# Altium footprint library PART.PcbLib: 407 footprints (part 20 of 26)
Each footprint in its own frame and in the unit in brackets; x right, y up, seen from the top. Pads: shape width x height; smd on the part's side, far side on the other; paste and mask are expansions set on the pad; w line width, h text height; cw(c..) or ccw(c..) is an arc to the next point about the centre after c.
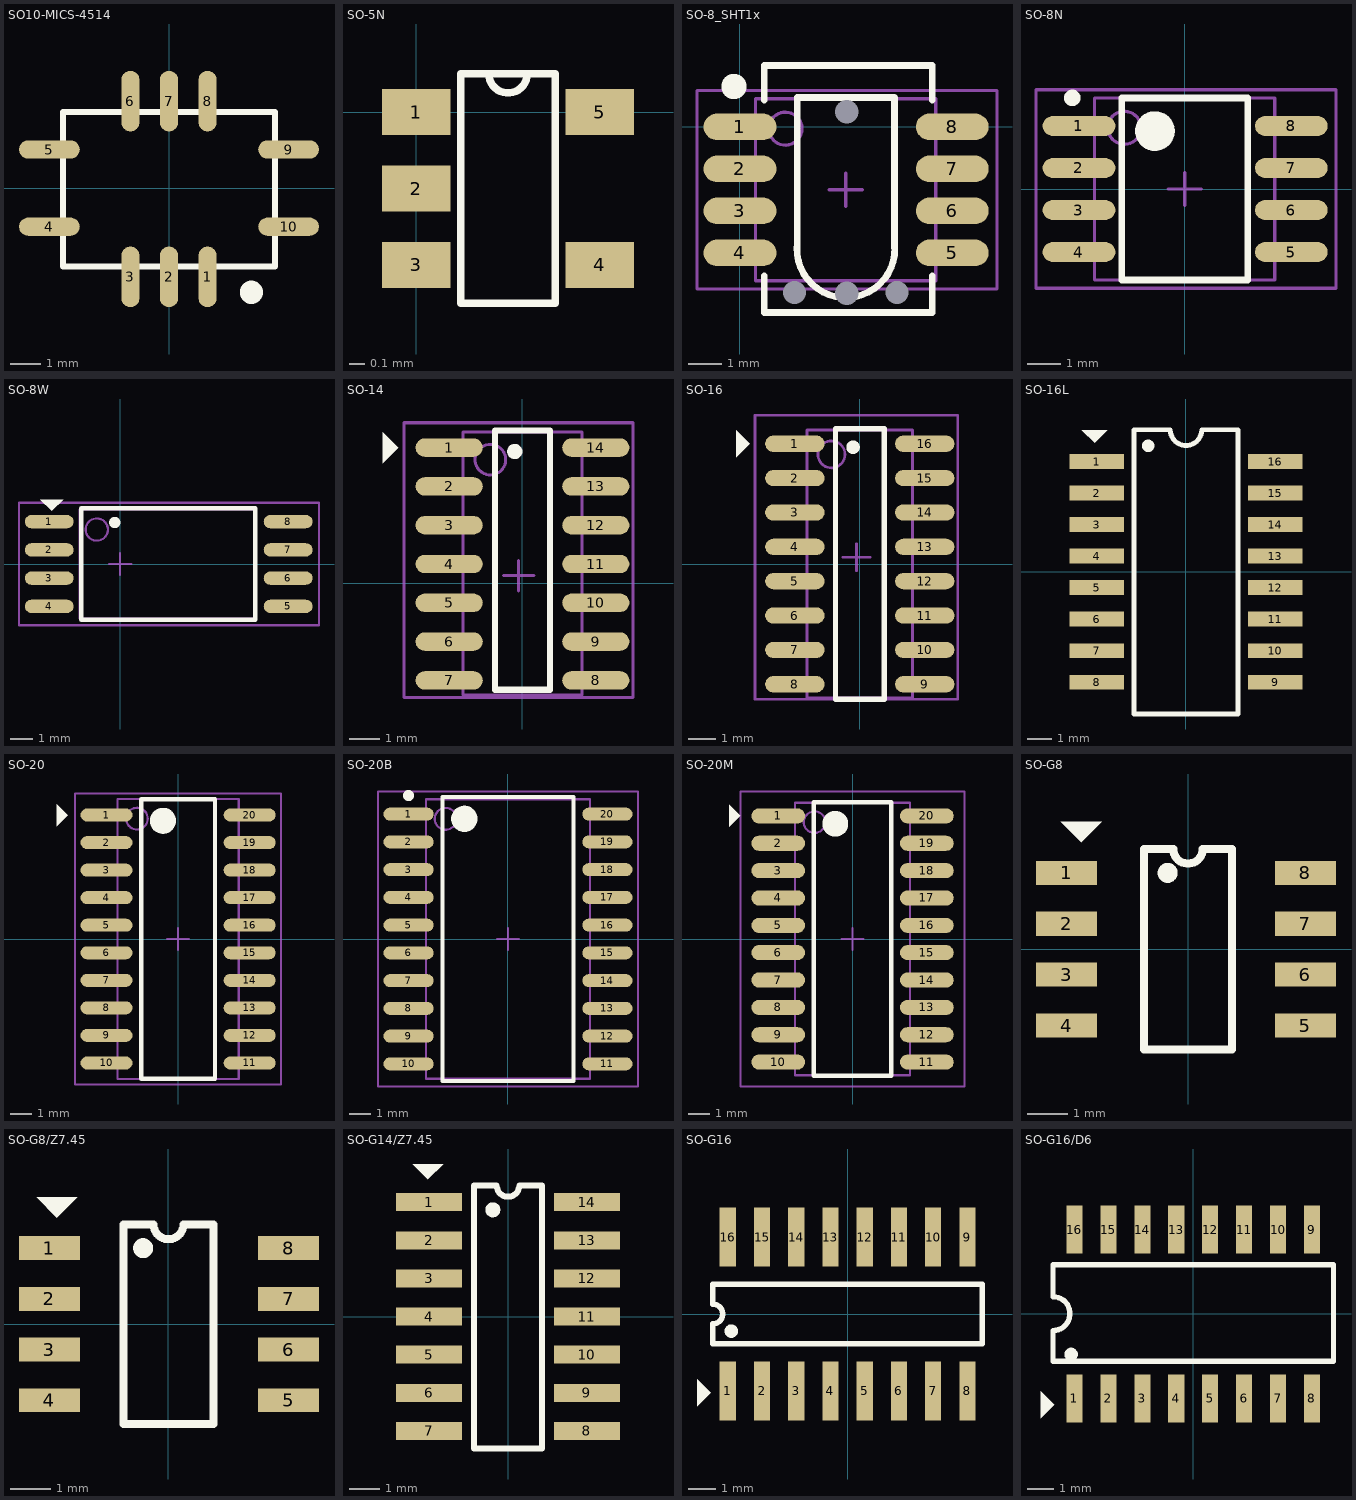
[diagram p19: the footprints below, top view; thin cyan lines are the x and y axes]

## SO10-MICS-4514 [mm] "10 pn"
pads (10):
  oval 0.6x2 smd: 1(1.27,-2.921) 2(0,-2.921) 3(-1.27,-2.921) 6(-1.27,2.863) 7(0,2.863) 8(1.27,2.863)
  oval 2x0.6 smd: 4(-3.937,-1.27) 5(-3.937,1.27) 9(3.937,1.27) 10(3.937,-1.27)
Top Overlay:
  circle w0.6: c2.713,-3.429 r0.081
  lines w0.203: -3.492,-2.574 -3.492,2.506 3.492,2.506 3.492,-2.574 -3.492,-2.574

## SO-5N [mm]
pads (5):
  rect 0.45x0.3 smd mask+0.05: 1(0,0) 2(0,-0.5) 3(0,-1) 4(1.2,-1) 5(1.2,0)
Top Overlay:
  lines w0.05: 0.29,-1.25 0.91,-1.25 0.91,0.25 0.475,0.25 ccw(c0.6,0.25) 0.725,0.25 0.29,0.25 0.29,-1.25

## SO-8_SHT1x [mm] "SOP, 8-Leads, Body 5.3x5.3mm, Pitch 1.27mm, IPC Medium Density"
height 2.03
pads (12):
  round 0 hole 0.7: 0(1.651,-5.004) 0(3.226,-5.029) 0(3.226,0.457) 0(4.75,-5.004)
  oval 2.2x0.8 smd: 1(0,0) 2(0,-1.27) 3(0,-2.54) 4(0,-3.81) 5(6.419,-3.81) 6(6.419,-2.54) 7(6.419,-1.27) 8(6.419,0)
Top Overlay:
  circle w0.6: c-0.183,1.219 r0.081
  lines w0.2: 0.737,-4.5 0.737,-5.613 5.817,-5.613 5.817,-4.5 ; 0.737,0.8 0.737,1.854 5.817,1.854 5.817,0.8
  lines w0.203: 1.72,-3.645 ccw(c3.2,-3.683) 4.681,-3.659 ; 1.727,-3.708 1.727,0.889 4.674,0.889 4.674,-3.658
Mechanical 13:
  circle w0.1: c1.372,-0.055 r0.5
  lines w0.1: 0.472,-4.655 0.472,0.845 5.922,0.845 5.922,-4.655 0.472,-4.655
Mechanical 15:
  lines w0.1: 2.697,-1.905 3.697,-1.905 ; 3.197,-2.405 3.197,-1.405 ; -1.299,-4.905 -1.299,1.095 7.769,1.095 7.769,-4.905 -1.299,-4.905
3D body: height 1.7, standoff 0, extent 0.098,-4.293 6.296,0.533

## SO-8N [mm] "SOP, 8-Leads, Body 5.3x5.3mm, Pitch 1.27mm, IPC Medium Density"
height 2.03
pads (8):
  oval 2.2x0.6 smd: 1(-3.197,1.905) 2(-3.197,0.635) 3(-3.197,-0.635) 4(-3.197,-1.905) 5(3.222,-1.905) 6(3.222,-0.635) 7(3.222,0.635) 8(3.222,1.905)
Top Overlay:
  circle w0.6: c-0.9,1.75 r0.3
  circle w0.25: c-3.4,2.755 r0.125
  lines w0.2: -1.9,-2.75 1.9,-2.75 1.9,2.75 -1.9,2.75 -1.9,-2.75
Mechanical 13:
  circle w0.1: c-1.825,1.85 r0.5
  lines w0.1: -2.725,-2.75 2.725,-2.75 2.725,2.75 -2.725,2.75 -2.725,-2.75
Mechanical 15:
  lines w0.1: -0.5,0 0.5,0 ; 0,-0.5 0,0.5 ; -4.496,-3 4.572,-3 4.572,3 -4.496,3 -4.496,-3
3D body: height 1.7, standoff 0, extent -3.099,-2.388 3.099,2.438

## SO-8W [mm] "8-Pin Small Outline Integrated Circuit 1.27 mm Pitch, IPC Medium Density"
height 1.75
pads (8):
  oval 2.2x0.6 smd: 1(-3.187,1.905) 2(-3.187,0.635) 3(-3.187,-0.635) 4(-3.187,-1.905) 5(7.556,-1.905) 6(7.556,-0.635) 7(7.556,0.635) 8(7.556,1.905)
Top Overlay:
  circle w0.25: c-0.241,1.866 r0.125
  region: -3.581,2.896 -3.073,2.388 -2.565,2.896
  lines w0.2: -1.753,-2.5 6.071,-2.5 6.071,2.5 -1.753,2.5 -1.753,-2.5
Mechanical 13:
  circle w0.1: c-1.05,1.55 r0.5
  lines w0.1: -1.829,-2.45 6.096,-2.45 6.096,2.45 -1.829,2.45 -1.829,-2.45
Mechanical 15:
  lines w0.1: -0.5,0 0.5,0 ; 0,-0.5 0,0.5 ; -4.547,-2.75 8.941,-2.75 8.941,2.75 -4.547,2.75 -4.547,-2.75
3D body: height 1.7, standoff 0, extent -3.124,-2.413 7.518,2.413

## SO-14 [mm] "SOIC, 14-Leads, Body 9.9x3.9mm, Pitch 1.27mm, IPC Medium Density"
height 1.75
pads (14):
  oval 2.2x0.6 smd: 1(-2.4,4.445) 2(-2.4,3.175) 3(-2.4,1.905) 4(-2.4,0.635) 5(-2.4,-0.635) 6(-2.4,-1.905) 7(-2.4,-3.175) 8(2.4,-3.175) 9(2.4,-1.905) 10(2.4,-0.635) 11(2.4,0.635) 12(2.4,1.905) 13(2.4,3.175) 14(2.4,4.445)
Top Overlay:
  circle w0.25: c-0.252,4.318 r0.125
  region: -4.572,3.937 -4.064,4.445 -4.572,4.953
  lines w0.2: -0.9,-3.48 -0.9,5 0.9,5 0.9,-3.48 -0.9,-3.48
Mechanical 13:
  circle w0.1: c-1.05,4.05 r0.5
  lines w0.1: -1.95,-3.658 -1.95,4.95 1.95,4.95 1.95,-3.658 -1.95,-3.658
Mechanical 15:
  lines w0.1: -0.627,0.254 0.373,0.254 ; -0.127,-0.246 -0.127,0.754 ; -3.877,-3.734 -3.877,5.258 3.623,5.258 3.623,-3.734 -3.877,-3.734
3D body: height 1.7, standoff 0, extent -2.997,-3.708 3.2,4.928

## SO-16 [mm] "SOIC, 16-Leads, Body 9.9x3.9mm, Pitch 1.27mm, IPC Medium Density"
height 1.75
pads (16):
  oval 2.2x0.6 smd: 1(-2.4,4.445) 2(-2.4,3.175) 3(-2.4,1.905) 4(-2.4,0.635) 5(-2.4,-0.635) 6(-2.4,-1.905) 7(-2.4,-3.175) 8(-2.4,-4.445) 9(2.4,-4.445) 10(2.4,-3.175) 11(2.4,-1.905) 12(2.4,-0.635) 13(2.4,0.635) 14(2.4,1.905) 15(2.4,3.175) 16(2.4,4.445)
Top Overlay:
  circle w0.25: c-0.252,4.318 r0.125
  region: -4.572,3.937 -4.064,4.445 -4.572,4.953
  lines w0.2: -0.9,-5 0.9,-5 0.9,5 -0.9,5 -0.9,-5
Mechanical 13:
  circle w0.1: c-1.05,4.05 r0.5
  lines w0.1: -1.95,-4.95 1.95,-4.95 1.95,4.95 -1.95,4.95 -1.95,-4.95
Mechanical 15:
  lines w0.1: -0.627,0.254 0.373,0.254 ; -0.127,-0.246 -0.127,0.754 ; -3.877,-4.996 3.623,-4.996 3.623,5.504 -3.877,5.504 -3.877,-4.996
3D body: height 1.75, standoff 0, extent -1.95,-4.95 1.95,4.95

## SO-16L [mm] "Small Outline; 16 Leads; Body Width 5.6 mm; Pitch 1.27 mm"
height 2
pads (16):
  rect 2.2x0.6 smd: 1(-3.6,4.445) 2(-3.6,3.175) 3(-3.6,1.905) 4(-3.6,0.635) 5(-3.6,-0.635) 6(-3.6,-1.905) 7(-3.6,-3.175) 8(-3.6,-4.445) 9(3.6,-4.445) 10(3.6,-3.175) 11(3.6,-1.905) 12(3.6,-0.635) 13(3.6,0.635) 14(3.6,1.905) 15(3.6,3.175) 16(3.6,4.445)
Top Overlay:
  circle w0.25: c-1.524,5.078 r0.125
  region: -4.191,5.715 -3.683,5.207 -3.175,5.715
  lines w0.2: -2.1,-5.725 -2.1,5.725 -0.635,5.725 ccw(c0,5.725) 0.635,5.725 2.1,5.725 2.1,-5.725 -2.1,-5.725

## SO-20 [mm] "20-Pin Small Outline Package 1.27 mm Pitch"
height 2
pads (20):
  oval 2.4x0.6 smd: 1(-3.3,5.715) 2(-3.3,4.445) 3(-3.3,3.175) 4(-3.3,1.905) 5(-3.3,0.635) 6(-3.3,-0.635) 7(-3.3,-1.905) 8(-3.3,-3.175) 9(-3.3,-4.445) 10(-3.3,-5.715) 11(3.3,-5.715) 12(3.3,-4.445) 13(3.3,-3.175) 14(3.3,-1.905) 15(3.3,-0.635) 16(3.3,0.635) 17(3.3,1.905) 18(3.3,3.175) 19(3.3,4.445) 20(3.3,5.715)
Top Overlay:
  circle w0.6: c-0.7,5.45 r0.3
  region: -5.588,5.207 -5.08,5.715 -5.588,6.223
  lines w0.2: -1.7,-6.45 1.7,-6.45 1.7,6.45 -1.7,6.45 -1.7,-6.45
Mechanical 13:
  circle w0.1: c-1.9,5.55 r0.5
  lines w0.1: -2.8,-6.45 2.8,-6.45 2.8,6.45 -2.8,6.45 -2.8,-6.45
Mechanical 15:
  lines w0.1: -0.5,0 0.5,0 ; 0,-0.5 0,0.5 ; -4.75,-6.7 4.75,-6.7 4.75,6.7 -4.75,6.7 -4.75,-6.7
3D body: height 2, standoff 0, extent -2.8,-6.45 2.8,6.45

## SO-20B [mm] "SOIC, 20-Leads, Body 12.8x7.5mm, Pitch 1.27mm, IPC Medium Density"
height 2.6
pads (20):
  oval 2.3x0.6 smd: 1(-4.55,5.715) 2(-4.55,4.445) 3(-4.55,3.175) 4(-4.55,1.905) 5(-4.55,0.635) 6(-4.55,-0.635) 7(-4.55,-1.905) 8(-4.55,-3.175) 9(-4.55,-4.445) 10(-4.55,-5.715) 11(4.55,-5.715) 12(4.55,-4.445) 13(4.55,-3.175) 14(4.55,-1.905) 15(4.55,-0.635) 16(4.55,0.635) 17(4.55,1.905) 18(4.55,3.175) 19(4.55,4.445) 20(4.55,5.715)
Top Overlay:
  circle w0.25: c-4.55,6.565 r0.125
  circle w0.6: c-2,5.5 r0.3
  lines w0.2: -3,-6.5 -3,6.5 3,6.5 3,-6.5 -3,-6.5
Mechanical 13:
  circle w0.1: c-2.85,5.5 r0.5
  lines w0.1: -3.75,-6.4 -3.75,6.4 3.75,6.4 3.75,-6.4 -3.75,-6.4
Mechanical 15:
  lines w0.1: -0.5,0 0.5,0 ; 0,-0.5 0,0.5 ; -5.95,-6.75 -5.95,6.75 5.95,6.75 5.95,-6.75 -5.95,-6.75
3D body: height 1.7, standoff 0, extent -4.039,-6.248 4.14,6.198

## SO-20M [mm] "SOP, 20-Leads, Body 12.6x5.3mm, Pitch 1.27mm, IPC Low Density"
height 1.96
pads (20):
  oval 2.5x0.7 smd: 1(-3.45,5.715) 2(-3.45,4.445) 3(-3.45,3.175) 4(-3.45,1.905) 5(-3.45,0.635) 6(-3.45,-0.635) 7(-3.45,-1.905) 8(-3.45,-3.175) 9(-3.45,-4.445) 10(-3.45,-5.715) 11(3.45,-5.715) 12(3.45,-4.445) 13(3.45,-3.175) 14(3.45,-1.905) 15(3.45,-0.635) 16(3.45,0.635) 17(3.45,1.905) 18(3.45,3.175) 19(3.45,4.445) 20(3.45,5.715)
Top Overlay:
  circle w0.6: c-0.8,5.35 r0.3
  region: -5.715,5.207 -5.207,5.715 -5.715,6.223
  lines w0.2: -1.8,-6.35 1.8,-6.35 1.8,6.35 -1.8,6.35 -1.8,-6.35
Mechanical 13:
  circle w0.1: c-1.765,5.425 r0.5
  lines w0.1: -2.665,-6.325 2.665,-6.325 2.665,6.325 -2.665,6.325 -2.665,-6.325
Mechanical 15:
  lines w0.1: -0.5,0 0.5,0 ; 0,-0.5 0,0.5 ; -5.2,-6.85 5.2,-6.85 5.2,6.85 -5.2,6.85 -5.2,-6.85
3D body: height 1.96, standoff 0, extent -2.665,-6.325 2.665,6.325

## SO-G8 [mil] "Small Outline; 8 Leads; Body Width 3.9 mm; Pitch 1.27 mm"
height 68.9
pads (8):
  rect 60x23.62 smd: 1(-119.36,75) 2(-119.36,25) 3(-119.36,-25) 4(-119.36,-75) 5(115.36,-75) 6(115.36,-25) 7(115.36,25) 8(115.36,75)
Top Overlay:
  circle w9.84: c-20,74.92 r4.92
  region: -125,125 -105,105 -85,125
  lines w7.87: -43.31,-98.42 43.31,-98.42 43.31,98.42 14.44,98.42 cw(c0,98.42) -14.44,98.42 -43.31,98.42 -43.31,-98.42
3D body: height 67, standoff 0, extent -124,-95 120,95

## SO-G8/Z7.45 [mil] "Small Outline; 8 Leads; Body Width 3.9 mm; Pitch 1.27 mm"
height 68.9
pads (8):
  rect 60x23.62 smd: 1(-117.35,75) 2(-117.35,25) 3(-117.35,-25) 4(-117.35,-75) 5(118.35,-75) 6(118.35,-25) 7(118.35,25) 8(118.35,75)
Top Overlay:
  circle w9.84: c-25,74.92 r4.92
  region: -130,125 -110,105 -90,125
  lines w7.87: -44.29,-98.43 44.29,-98.43 44.29,98.43 14.76,98.43 cw(c0,98.43) -14.76,98.43 -44.29,98.43 -44.29,-98.43
3D body: height 67, standoff 0, extent -120,-95 124,95

## SO-G14/Z7.45 [mm] "Small Outline; 14 Leads; Body Width 3.9 mm; Pitch 1.27 mm"
height 1.75
pads (14):
  rect 2.2x0.6 smd: 1(-2.625,3.81) 2(-2.625,2.54) 3(-2.625,1.27) 4(-2.625,0) 5(-2.625,-1.27) 6(-2.625,-2.54) 7(-2.625,-3.81) 8(2.625,-3.81) 9(2.625,-2.54) 10(2.625,-1.27) 11(2.625,0) 12(2.625,1.27) 13(2.625,2.54) 14(2.625,3.81)
Top Overlay:
  circle w0.25: c-0.508,3.554 r0.125
  region: -3.175,5.08 -2.667,4.572 -2.159,5.08
  lines w0.2: -1.125,-4.394 -1.125,4.365 -0.375,4.365 ccw(c0,4.365) 0.375,4.365 1.125,4.365 1.125,-4.394 -1.125,-4.394
3D body: height 1.7, standoff 0, extent -2.972,-4.38 3.028,4.42

## SO-G16 [mm] "Small Outline; 16 Leads; Body Width 3.9 mm; Pitch 1.27 mm"
height 1.75
pads (16):
  rect 0.6x2.2 smd: 1(-4.445,-2.854) 2(-3.175,-2.854) 3(-1.905,-2.854) 4(-0.635,-2.854) 5(0.635,-2.854) 6(1.905,-2.854) 7(3.175,-2.854) 8(4.445,-2.854) 9(4.445,2.854) 10(3.175,2.854) 11(1.905,2.854) 12(0.635,2.854) 13(-0.635,2.854) 14(-1.905,2.854) 15(-3.175,2.854) 16(-4.445,2.854)
Top Overlay:
  circle w0.25: c-4.316,-0.635 r0.125
  region: -5.588,-3.429 -5.08,-2.921 -5.588,-2.413
  lines w0.2: -5,-1.1 5,-1.1 5,1.1 -5,1.1 -5,0.367 cw(c-5,0) -5,-0.367 -5,-1.1

## SO-G16/D6 [mm] "Small Outline; 16 Leads; Body Width 5.3 mm; Pitch 1.27 mm"
height 2
pads (16):
  rect 0.6x1.8 smd: 1(-4.445,-3.168) 2(-3.175,-3.168) 3(-1.905,-3.168) 4(-0.635,-3.168) 5(0.635,-3.168) 6(1.905,-3.168) 7(3.175,-3.168) 8(4.445,-3.168) 9(4.445,3.143) 10(3.175,3.143) 11(1.905,3.143) 12(0.635,3.143) 13(-0.635,3.143) 14(-1.905,3.143) 15(-3.175,3.143) 16(-4.445,3.143)
Top Overlay:
  circle w0.25: c-4.57,-1.524 r0.125
  region: -5.715,-3.912 -5.207,-3.404 -5.715,-2.896
  lines w0.2: -5.25,-1.778 -5.25,-0.635 ccw(c-5.25,0) -5.25,0.635 -5.25,1.829 5.25,1.829 5.25,-1.778 -5.25,-1.778